# Altium footprint library PCB-PCEIOT.PcbLib: 119 footprints (part 6 of 8)
Each footprint in its own frame and in the unit in brackets; x right, y up, seen from the top. Pads: shape width x height; smd on the part's side, far side on the other; paste and mask are expansions set on the pad; w line width, h text height; cw(c..) or ccw(c..) is an arc to the next point about the centre after c.
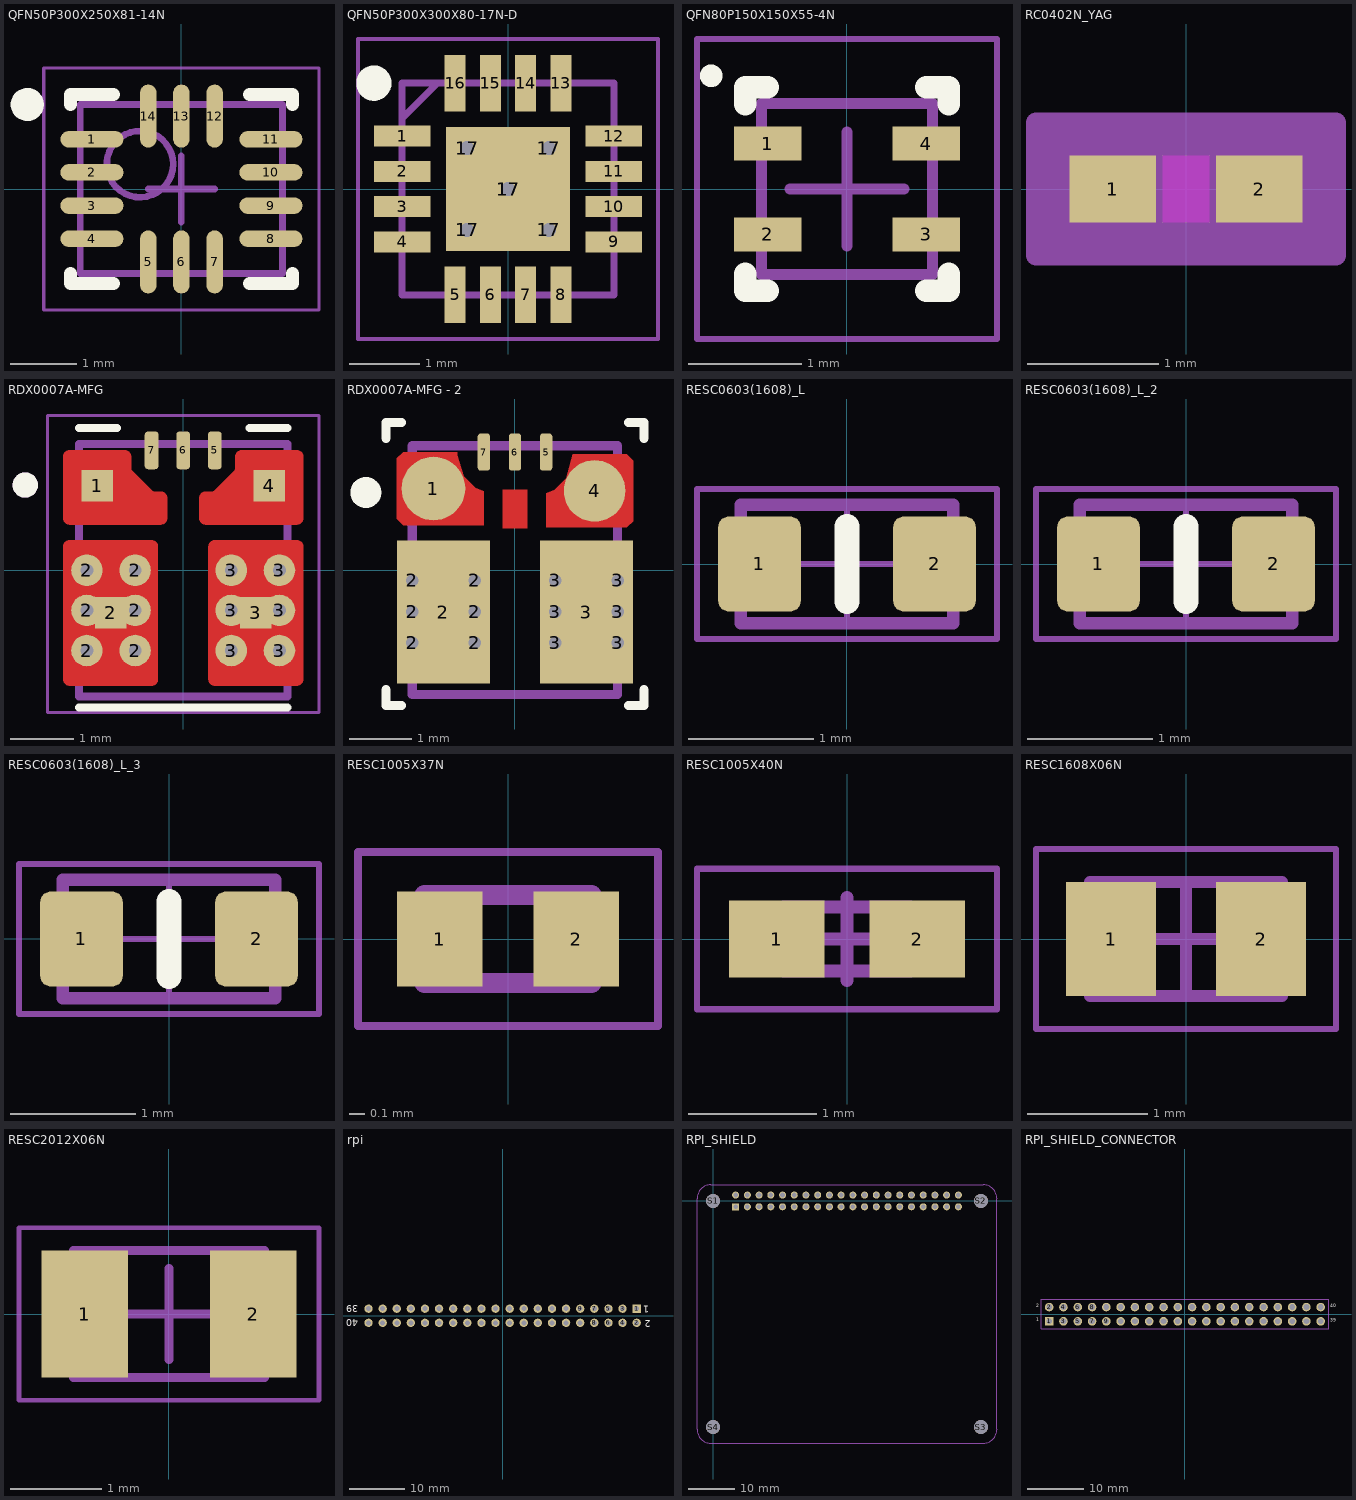
[diagram p5: the footprints below, top view; thin cyan lines are the x and y axes]

## QFN50P300X250X81-14N [mm] "QFN, 14-Leads, Body 3,00x2,50mm, Pitch 0,50mm, IPC Medium Density"
height 0.81
pads (14):
  oval 0.95x0.25 smd mask+0.02: 1(-1.35,0.75) 2(-1.35,0.25) 3(-1.35,-0.25) 4(-1.35,-0.75) 8(1.35,-0.75) 9(1.35,-0.25) 10(1.35,0.25) 11(1.35,0.75)
  oval 0.25x0.95 smd mask+0.02: 5(-0.5,-1.1) 6(0,-1.1) 7(0.5,-1.1) 12(0.5,1.1) 13(0,1.1) 14(-0.5,1.1)
Top Overlay:
  circle w0.25: c-2.325,1.275 r0.125
  lines w0.2: -1.675,-1.275 -1.675,-1.425 -1.025,-1.425 ; -1.675,1.275 -1.675,1.425 -1.025,1.425 ; 1.025,-1.425 1.675,-1.425 1.675,-1.275 ; 1.025,1.425 1.675,1.425 1.675,1.275
Mechanical 13:
  circle w0.1: c-0.625,0.375 r0.5
  lines w0.1: -1.525,-1.275 -1.525,1.275 1.525,1.275 1.525,-1.275 -1.525,-1.275
Mechanical 15:
  lines w0.05: -2.075,-1.825 -2.075,1.825 2.075,1.825 2.075,-1.825 -2.075,-1.825
  lines w0.1: -0.5,0 0.5,0 ; 0,-0.5 0,0.5
3D body "QFN50P300X250X81-14N.step": height 0.81, standoff 0, extent -1.625,-1.375 1.625,1.375

## QFN50P300X300X80-17N-D [mm]
pads (22):
  rect 0.8x0.3 smd: 1(-1.5,0.75) 2(-1.5,0.25) 3(-1.5,-0.25) 4(-1.5,-0.75) 9(1.5,-0.75) 10(1.5,-0.25) 11(1.5,0.25) 12(1.5,0.75)
  rect 0.3x0.8 smd: 5(-0.75,-1.5) 6(-0.25,-1.5) 7(0.25,-1.5) 8(0.75,-1.5) 13(0.75,1.5) 14(0.25,1.5) 15(-0.25,1.5) 16(-0.75,1.5)
  round 0.5 hole 0.2 mask-0.26: 17(-0.58,-0.58) 17(-0.58,0.58) 17(0,0) 17(0.58,-0.58) 17(0.58,0.58)
  rect 1.75x1.75 smd: 17(0,0)
Top Overlay:
  circle w0.25: c-1.9,1.5 r0.125
Mechanical 15:
  lines w0.1: -1.5,1 -1,1.5 ; -1.5,-1.5 1.5,-1.5 1.5,1.5 -1.5,1.5 -1.5,-1.5
Bottom Assembly:
  lines w0.05: -2.125,-2.125 2.125,-2.125 2.125,2.125 -2.125,2.125 -2.125,-2.125
3D body "TLV9004SIRTER.stp": height 0.8, standoff 0, extent -1.5,-1.5 1.5,1.5

## QFN80P150X150X55-4N [mm] "QFN, 4-Leads, Body 1,50x1,50mm, Pitch 0,80mm, IPC Medium Density"
height 0.55
pads (4):
  rect 0.6x0.3 smd mask+0.05: 1(-0.7,0.4) 2(-0.7,-0.4) 3(0.7,-0.4) 4(0.7,0.4)
Top Overlay:
  circle w0.1: c-1.2,1 r0.05
  lines w0.2: -0.9,-0.75 -0.9,-0.9 -0.7,-0.9 ; -0.9,0.75 -0.9,0.9 -0.7,0.9 ; 0.7,-0.9 0.9,-0.9 0.9,-0.75 ; 0.7,0.9 0.9,0.9 0.9,0.75
Mechanical 13:
  lines w0.1: -0.755,-0.755 0.755,-0.755 0.755,0.755 -0.755,0.755 -0.755,-0.755
Mechanical 15:
  lines w0.05: -1.325,-1.325 1.325,-1.325 1.325,1.325 -1.325,1.325 -1.325,-1.325
  lines w0.1: -0.5,0 0.5,0 ; 0,-0.5 0,0.5
3D body "QFN80P150X150X55-4N.step": height 0.55, standoff 0, extent -0.855,-0.755 0.855,0.755

## RC0402N_YAG [mil]
pads (2):
  rect 26x20 smd paste+0 mask+0: 1(-22,0) 2(22,0)
Top Layer keep-out:
  region: -7,-8 -7,8 7,8 7,-8
Keep-Out Layer:
  region: -7,-10 -7,10 7,10 7,-10
Mechanical 13:
  lines w1: -21,-10 -21,10 ; -21,-10 21,-10 ; -21,-10 -9,-10 -9,10 -21,10 ; -21,-10 -21,10 ; -21,10 21,10 ; 21,-10 21,10 ; 21,-10 21,10 ; 21,-10 9,-10 9,10 21,10
Mechanical 15:
  region: 45,-20 -45,-20 -45,20 45,20
  lines w6: -45,-20 45,-20 45,20 -45,20 -45,-20
3D body "RC0402N_YAG.step": height 27.99, standoff 0, extent -20.98,-10 20.98,10

## RDX0007A-MFG [mm]
height 2.1
pads (19):
  rect 0.5x0.5 smd paste-1 mask+0: 1(-1.362,1.338) 2(-1.15,-0.675) 3(1.15,-0.675) 4(1.362,1.338)
  round 0.5 hole 0.2 mask+0: 2(-1.524,-1.27) 2(-1.524,-0.635) 2(-0.762,-1.27) 2(-0.762,-0.635) 2(-0.762,0) 3(0.762,-1.27) 3(0.762,-0.635) 3(0.762,0) 3(1.524,-1.27) 3(1.524,-0.635) 3(1.524,0)
  round 0.5 hole 0.2 mask+0.102: 2(-1.524,0)
  rrect50% 0.22x0.6 smd mask+0: 5(0.5,1.9) 6(0,1.9) 7(-0.5,1.9)
Top Layer:
  region: 1.81,0.474 1.816,0.474 1.821,0.473 1.826,0.472 1.831,0.47 1.836,0.468 1.841,0.466 1.845,0.464 1.85,0.462 1.854,0.459 1.859,0.456 1.863,0.453 1.867,0.449 1.871,0.446 1.874,0.442 1.878,0.438 1.881,0.434 1.884,0.429 1.887,0.425 1.889,0.42 1.891,0.416 1.893,0.411 1.895,0.406 1.897,0.401 1.898,0.396 1.899,0.391 1.899,0.385 1.9,0.38 1.9,0.375 1.9,-1.725 1.9,-1.73 1.899,-1.735 1.899,-1.741 1.898,-1.746 1.897,-1.751 1.895,-1.756 1.893,-1.761 1.891,-1.766 1.889,-1.77 1.887,-1.775 1.884,-1.779 1.881,-1.784 1.878,-1.788 1.874,-1.792 1.871,-1.796 1.867,-1.799 1.863,-1.803 1.859,-1.806 1.854,-1.809 1.85,-1.812 1.845,-1.814 1.841,-1.816 1.836,-1.818 1.831,-1.82 1.826,-1.822 1.821,-1.823 1.816,-1.824 1.81,-1.824 1.805,-1.825 0.495,-1.825 0.49,-1.824 0.484,-1.824 0.479,-1.823 0.474,-1.822 0.469,-1.82 0.464,-1.818 0.459,-1.816 0.455,-1.814 0.45,-1.812 0.446,-1.809 0.441,-1.806 0.437,-1.803 0.433,-1.799 0.429,-1.796 0.426,-1.792 0.422,-1.788 0.419,-1.784 0.416,-1.779 0.413,-1.775 0.411,-1.77 0.409,-1.766 0.407,-1.761 0.405,-1.756 0.403,-1.751 0.402,-1.746 0.401,-1.741 0.401,-1.735 0.4,-1.73 0.4,-1.725 0.4,0.375 0.4,0.38 0.401,0.385 0.401,0.391 0.402,0.396 0.403,0.401 0.405,0.406 0.407,0.411 0.409,0.416 0.411,0.42 0.413,0.425 0.416,0.429 0.419,0.434 0.422,0.438 0.426,0.442 0.429,0.446 0.433,0.449 0.437,0.453 0.441,0.456 0.446,0.459 0.45,0.462 0.455,0.464 0.459,0.466 0.464,0.468 0.469,0.47 0.474,0.472 0.479,0.473 0.484,0.474 0.49,0.474 0.495,0.475 1.805,0.475
  region: 204 vertices and 0 holes, not listed, extent -1.9,0.725 -0.255,1.9
  region: 204 vertices and 0 holes, not listed, extent 0.255,0.725 1.9,1.9
  region: -0.49,0.474 -0.484,0.474 -0.479,0.473 -0.474,0.472 -0.469,0.47 -0.464,0.468 -0.459,0.466 -0.455,0.464 -0.45,0.462 -0.446,0.459 -0.441,0.456 -0.437,0.453 -0.433,0.449 -0.429,0.446 -0.426,0.442 -0.422,0.438 -0.419,0.434 -0.416,0.429 -0.413,0.425 -0.411,0.42 -0.409,0.416 -0.407,0.411 -0.405,0.406 -0.403,0.401 -0.402,0.396 -0.401,0.391 -0.401,0.385 -0.4,0.38 -0.4,0.375 -0.4,-1.725 -0.4,-1.73 -0.401,-1.735 -0.401,-1.741 -0.402,-1.746 -0.403,-1.751 -0.405,-1.756 -0.407,-1.761 -0.409,-1.766 -0.411,-1.77 -0.413,-1.775 -0.416,-1.779 -0.419,-1.784 -0.422,-1.788 -0.426,-1.792 -0.429,-1.796 -0.433,-1.799 -0.437,-1.803 -0.441,-1.806 -0.446,-1.809 -0.45,-1.812 -0.455,-1.814 -0.459,-1.816 -0.464,-1.818 -0.469,-1.82 -0.474,-1.822 -0.479,-1.823 -0.484,-1.824 -0.49,-1.824 -0.495,-1.825 -1.805,-1.825 -1.81,-1.824 -1.816,-1.824 -1.821,-1.823 -1.826,-1.822 -1.831,-1.82 -1.836,-1.818 -1.841,-1.816 -1.845,-1.814 -1.85,-1.812 -1.854,-1.809 -1.859,-1.806 -1.863,-1.803 -1.867,-1.799 -1.871,-1.796 -1.874,-1.792 -1.878,-1.788 -1.881,-1.784 -1.884,-1.779 -1.887,-1.775 -1.889,-1.77 -1.891,-1.766 -1.893,-1.761 -1.895,-1.756 -1.897,-1.751 -1.898,-1.746 -1.899,-1.741 -1.899,-1.735 -1.9,-1.73 -1.9,-1.725 -1.9,0.375 -1.9,0.38 -1.899,0.385 -1.899,0.391 -1.898,0.396 -1.897,0.401 -1.895,0.406 -1.893,0.411 -1.891,0.416 -1.889,0.42 -1.887,0.425 -1.884,0.429 -1.881,0.434 -1.878,0.438 -1.874,0.442 -1.871,0.446 -1.867,0.449 -1.863,0.453 -1.859,0.456 -1.854,0.459 -1.85,0.462 -1.845,0.464 -1.841,0.466 -1.836,0.468 -1.831,0.47 -1.826,0.472 -1.821,0.473 -1.816,0.474 -1.81,0.474 -1.805,0.475 -0.495,0.475
Top Overlay:
  circle w0.2: c-2.5,1.35 r0.1
  lines w0.127: -1.65,-2.175 1.65,-2.175 ; -1.65,2.25 -1.05,2.25 ; 1.05,2.25 1.65,2.25
Top Paste:
  drawing of 8 lines, arcs and shapes, not listed
Top Solder:
  drawing of 7 lines, arcs and shapes, not listed
Mechanical 13:
  circle w0.2: c-2.5,1.35 r0.1
  lines w0.127: -1.65,-2 1.65,-2 1.65,2 -1.65,2 -1.65,-2
Mechanical 15:
  lines w0.05: -2.15,-2.25 2.15,-2.25 2.15,2.45 -2.15,2.45 -2.15,-2.25
3D body "step_temp.STEP": height 2.1, standoff 0, extent -1.65,-2 1.65,2

## RDX0007A-MFG - 2 [mm]
pads (19):
  round 1.025 smd paste-0.5 mask-0.495: 1(-1.312,1.312)
  round 0.5 hole 0.2 paste-0.25 mask-0.05: 2(-1.65,-1.165) 2(-1.65,-0.665) 2(-1.65,-0.165) 2(-0.65,-1.165) 2(-0.65,-0.665) 2(-0.65,-0.165) 3(0.65,-1.165) 3(0.65,-0.665) 3(0.65,-0.165) 3(1.65,-1.165) 3(1.65,-0.665) 3(1.65,-0.165)
  rect 1.5x2.3 smd paste-1.137 mask-1.143: 2(-1.15,-0.675) 3(1.15,-0.675)
  round 0.991 smd paste-0.483 mask-0.483: 4(1.281,1.276)
  rrect50% 0.2x0.6 smd paste+0 mask-0.292: 5(0.5,1.9) 6(0,1.9) 7(-0.5,1.9)
Top Layer:
  region: 1.9,0.788 1.9,1.763 1.8,1.863 0.925,1.863 0.825,1.478 0.637,1.29 0.5,1.234 0.5,0.688 1.8,0.688
  region: -1.9,0.825 -1.9,1.8 -1.8,1.9 -0.925,1.9 -0.925,1.85 -0.825,1.515 -0.637,1.327 -0.5,1.271 -0.5,0.725 -1.8,0.725
  region: -0.2,1.295 -0.2,0.675 0.2,0.675 0.2,1.295
Top Overlay:
  circle w0.25: c-2.4,1.25 r0.125
  lines w0.15: -2.075,-1.925 -2.075,-2.175 -1.825,-2.175 ; -2.075,2.125 -2.075,2.375 -1.825,2.375 ; 1.825,-2.175 2.075,-2.175 2.075,-1.925 ; 1.825,2.375 2.075,2.375 2.075,2.125
Top Paste:
  drawing of 8 lines, arcs and shapes, not listed
Top Solder:
  drawing of 7 lines, arcs and shapes, not listed
Mechanical 13:
  lines w0.15: -1.65,-2 1.65,-2 1.65,2 -1.65,2 -1.65,-2
Mechanical 15:
  text ".Designator" at 0.272,-2.705 h1.2
3D body "step_temp.STEP": height 2.1, standoff 0, extent -1.65,-2 1.65,2

## RESC0603(1608)_L [mm] "Chip Resistor, Body 1.6x0.8mm, IPC High Density"
height 0.6
pads (2):
  rrect25% 0.66x0.76 smd: 1(-0.7,0) 2(0.7,0)
Top Overlay:
  lines w0.2: 0,-0.3 0,0.3
Top Courtyard:
  lines w0.05: -0.475,0 0.475,0 ; 0,-0.475 0,0.475 ; -1.2,-0.6 -1.2,0.6 1.2,0.6 1.2,-0.6 -1.2,-0.6
Top Assembly:
  lines w0.1: -0.85,-0.475 -0.85,0.475 0.85,0.475 0.85,-0.475 -0.85,-0.475
Top Designator:
  text ".Designator" at -1.27,-0.127 h0.6
3D body "RES0603.step": height 0.45, standoff 0, extent -0.8,-0.4 0.8,0.4

## RESC0603(1608)_L_2 [mm]
pads (2):
  rrect25% 0.66x0.76 smd: 1(-0.7,0) 2(0.7,0)
Top Overlay:
  lines w0.2: 0,-0.3 0,0.3
Top Courtyard:
  lines w0.05: -0.475,0 0.475,0 ; 0,-0.475 0,0.475 ; -1.2,-0.6 -1.2,0.6 1.2,0.6 1.2,-0.6 -1.2,-0.6
Top Assembly:
  lines w0.1: -0.85,-0.475 -0.85,0.475 0.85,0.475 0.85,-0.475 -0.85,-0.475
Top Designator:
  text ".Designator" at -1.27,-0.127 h0.6
3D body "RES0603.step": height 0.45, standoff 0, extent -0.8,-0.4 0.8,0.4

## RESC0603(1608)_L_3 [mm]
pads (2):
  rrect25% 0.66x0.76 smd: 1(-0.7,0) 2(0.7,0)
Top Overlay:
  lines w0.2: 0,-0.3 0,0.3
Mechanical 13:
  lines w0.1: -0.85,-0.475 0.85,-0.475 0.85,0.475 -0.85,0.475 -0.85,-0.475
Mechanical 15:
  lines w0.05: -0.475,0 0.475,0 ; 0,-0.475 0,0.475 ; -1.2,-0.6 1.2,-0.6 1.2,0.6 -1.2,0.6 -1.2,-0.6
Top Designator:
  text ".Designator" at -1.27,-0.127 h0.6
3D body "RES0603.step": height 0.45, standoff 0, extent -0.8,-0.4 0.8,0.4

## RESC1005X37N [mm]
pads (2):
  rect 0.54x0.6 smd: 1(-0.432,0) 2(0.432,0)
Mechanical 13:
  lines w0.127: -0.53,-0.28 -0.53,0.28 0.53,0.28 0.53,-0.28 -0.53,-0.28
Mechanical 15:
  lines w0.05: -0.95,-0.55 -0.95,0.55 0.95,0.55 0.95,-0.55 -0.95,-0.55

## RESC1005X40N [mm] "Chip Resistor, 2-Leads, Body 1,0x0,50mm (0402), IPC Medium Density"
pads (2):
  rect 0.75x0.6 smd: 1(-0.55,0) 2(0.55,0)
Mechanical 13:
  lines w0.1: -0.5,-0.25 0.5,-0.25 0.5,0.25 -0.5,0.25 -0.5,-0.25
Mechanical 15:
  lines w0.05: -1.175,-0.55 1.175,-0.55 1.175,0.55 -1.175,0.55 -1.175,-0.55
  lines w0.1: -0.325,0 0.325,0 ; 0,-0.325 0,0.325
  text ".Designator" at 0.272,-2.705 h1.2
3D body "RESC-0402.stp": height 0.4, standoff 0, extent -0.525,-0.275 0.525,0.275

## RESC1608X06N [mm] "Chip Resistor, 2-Leads, Body 1,6x0,8mm (0603), IPC Medium Density"
height 0.6
pads (2):
  rect 0.75x0.95 smd: 1(-0.625,0) 2(0.625,0)
Mechanical 13:
  lines w0.1: -0.8,-0.475 0.8,-0.475 0.8,0.475 -0.8,0.475 -0.8,-0.475
Mechanical 15:
  lines w0.05: -1.25,-0.75 1.25,-0.75 1.25,0.75 -1.25,0.75 -1.25,-0.75
  lines w0.1: -0.475,0 0.475,0 ; 0,-0.475 0,0.475
  text ".Designator" at 0.272,-2.705 h1.2
3D body "RESC-0603.stp": height 0.55, standoff 0, extent -0.85,-0.45 0.85,0.45

## RESC2012X06N [mm] "Chip Resistor, 2-Leads, Body 2,00x1,25mm (0805), IPC Medium Density"
height 0.55
pads (2):
  rect 0.95x1.4 smd: 1(-0.925,0) 2(0.925,0)
Mechanical 13:
  lines w0.1: -1.05,-0.7 -1.05,0.7 1.05,0.7 1.05,-0.7 -1.05,-0.7
Mechanical 15:
  lines w0.05: -1.65,-0.95 -1.65,0.95 1.65,0.95 1.65,-0.95 -1.65,-0.95
  lines w0.1: -0.5,0 0.5,0 ; 0,-0.5 0,0.5
  text ".Designator" at 0.452,-4.502 h2
3D body "RESC-0805.stp": height 0.6, standoff 0, extent -1.05,-0.675 1.05,0.675

## rpi [mm]
pads (40):
  rect 1.5x1.5 hole 0.9: 1(24.13,1.27)
  round 1.5 hole 0.9: 2(24.13,-1.27) 3(21.59,1.27) 4(21.59,-1.27) 5(19.05,1.27) 6(19.05,-1.27) 7(16.51,1.27) 8(16.51,-1.27) 9(13.97,1.27) 10(13.97,-1.27) 11(11.43,1.27) 12(11.43,-1.27) 13(8.89,1.27) 14(8.89,-1.27) 15(6.35,1.27) 16(6.35,-1.27) 17(3.81,1.27) 18(3.81,-1.27) 19(1.27,1.27) 20(1.27,-1.27) 21(-1.27,1.27) 22(-1.27,-1.27) 23(-3.81,1.27) 24(-3.81,-1.27) 25(-6.35,1.27) 26(-6.35,-1.27) 27(-8.89,1.27) 28(-8.89,-1.27) 29(-11.43,1.27) 30(-11.43,-1.27) 31(-13.97,1.27) 32(-13.97,-1.27) 33(-16.51,1.27) 34(-16.51,-1.27) 35(-19.05,1.27) 36(-19.05,-1.27) 37(-21.59,1.27) 38(-21.59,-1.27) 39(-24.13,1.27) 40(-24.13,-1.27)
Top Overlay:
  text "2" at 26.7,-0.775 h1.27
  text "1" at 26.4,1.775 h1.27
  text "39" at -26.025,1.9 h1.27
  text "40" at -25.95,-0.65 h1.27
Bottom Overlay:
  lines w0.2: -25.527,-2.54 25.4,-2.54 25.4,2.54 -25.527,2.54 -25.527,-2.54
3D body "female_header_a-bl254-dg-z32d.stp": height 8.5, standoff -3.2, extent -25.525,-2.625 15.365,2.375
3D body "female_header_a-bl254-dg-z32d.stp": height 8.5, standoff -3.2, extent -15.365,-2.627 25.525,2.373

## RPI_SHIELD [mil]
pads (44):
  rect 60x60 / inner round 60 / far side rect 60x60 hole 40 mask+4.02: 1(191.73,-50)
  round 60 hole 40 mask+4.02: 2(191.73,50) 3(291.73,-50) 4(291.73,50) 5(391.73,-50) 6(391.73,50) 7(491.73,-50) 8(491.73,50) 9(591.73,-50) 10(591.73,50) 11(691.73,-50) 12(691.73,50) 13(791.73,-50) 14(791.73,50) 15(891.73,-50) 16(891.73,50) 17(991.73,-50) 18(991.73,50) 19(1091.73,-50) 20(1091.73,50) 21(1191.73,-50) 22(1191.73,50) 23(1291.73,-50) 24(1291.73,50) 25(1391.73,-50) 26(1391.73,50) 27(1491.73,-50) 28(1491.73,50) 29(1591.73,-50) 30(1591.73,50) 31(1691.73,-50) 32(1691.73,50) 33(1791.73,-50) 34(1791.73,50) 35(1891.73,-50) 36(1891.73,50) 37(1991.73,-50) 38(1991.73,50) 39(2091.73,-50) 40(2091.73,50)
  round 118.11 hole 118.11 mask+0: S1(0,0) S2(2283.46,0) S3(2283.46,-1929.13) S4(0,-1929.13)
Mechanical 13:
  lines w5: -137.8,-1948.82 ccw(c-19.68,-1948.82) -19.69,-2066.93 2303.15,-2066.93 ccw(c2303.15,-1948.82) 2421.26,-1948.82 2421.26,19.69 ccw(c2303.15,19.69) 2303.15,137.8 -19.68,137.8 ccw(c-19.68,19.69) -137.8,19.69 -137.8,-1948.82

## RPI_SHIELD_CONNECTOR [mil]
pads (40):
  rect 60x60 / inner round 60 / far side rect 60x60 hole 40 mask+4.02: 1(-950,-50)
  round 60 hole 40 mask+4.02: 2(-950,50) 3(-850,-50) 4(-850,50) 5(-750,-50) 6(-750,50) 7(-650,-50) 8(-650,50) 9(-550,-50) 10(-550,50) 11(-450,-50) 12(-450,50) 13(-350,-50) 14(-350,50) 15(-250,-50) 16(-250,50) 17(-150,-50) 18(-150,50) 19(-50,-50) 20(-50,50) 21(50,-50) 22(50,50) 23(150,-50) 24(150,50) 25(250,-50) 26(250,50) 27(350,-50) 28(350,50) 29(450,-50) 30(450,50) 31(550,-50) 32(550,50) 33(650,-50) 34(650,50) 35(750,-50) 36(750,50) 37(850,-50) 38(850,50) 39(950,-50) 40(950,50)
Top Overlay:
  text "2" at -1042.32,39.37 h39.37
  text "1" at -1040.35,-60.04 h39.37
  text "39" at 1017.72,-62.01 h39.37
  text "40" at 1015.75,39.37 h39.37
Bottom Overlay:
  lines w7.87: -1000,-100 1005,-100 1005,100 -1000,100 -1000,-100
Mechanical 15:
  lines w3.94: -1004.92,-100 -1004.92,103.42 1004.84,103.42 1004.92,103.34 1004.92,-100 -801.5,-100 -1004.92,-100
  text ".Designator" at -106.49,-10.69 h47.24
3D body "female_header_a-bl254-dg-z32d.stp": height 334.65, standoff -125.98, extent -604.92,-93.51 1004.92,103.34
3D body "female_header_a-bl254-dg-z32d.stp": height 334.65, standoff -125.98, extent -1004.92,-93.43 604.92,103.42